# Altium schematic symbol library LATTICEPLDS_Library.SchLib: 291 symbols (part 29 of 32) (continued)
## LFXP2-40E-FPBGA672
designator U?  Data Sheet Version: Preliminary
SPLIT_INST: TRUE; SWAP_INFO: (S1+S2+S3+S4+S5+S6+S7+S8+S9+S10)
part A pins: A2 GND (power), A25 GND (power), AA3 GND (power), AA9 GND (power), AA18 GND (power), AA24 GND (power), AD6 GND (power), AD11 GND (power), AD16 GND (power), AD21 GND (power), AE1 GND (power), AE26 GND (power), AF2 GND (power), AF25 GND (power), B1 GND (power), B26 GND (power), C6 GND (power), C11 GND (power), C16 GND (power), C21 GND (power), D5 NC, F3 GND (power), F9 GND (power), F18 GND (power), F24 GND (power), J6 GND (power), J21 GND (power), K10 VCCAUX (power), K11 GND (power), K13 GND (power), K14 GND (power), K16 GND (power), K17 VCCAUX (power), L3 GND (power), L10 VCCAUX (power), L11 GND (power), L12 VCC (power), L13 VCC (power), L14 VCC (power), L15 VCC (power), L16 GND (power), L17 VCCAUX (power), L24 GND (power), M3 CFG0, M11 VCC (power), M12 VCC (power), M13 GND (power), M14 GND (power), M15 VCC (power), M16 VCC (power), N4 TOE, N9 GND (power), N10 GND (power), N11 VCC (power), N12 GND (power), N13 GND (power), N14 GND (power), N15 GND (power), N16 VCC (power), N17 GND (power), N18 GND (power), P9 GND (power), P10 GND (power), P11 VCC (power), P12 GND (power), P13 GND (power), P14 GND (power), P15 GND (power), P16 VCC (power), P17 GND (power), P18 GND (power), R11 VCC (power), R12 VCC (power), R13 GND (power), R14 GND (power), R15 VCC (power), R16 VCC (power), T3 GND (power), T10 VCCAUX (power), T11 GND (power), T12 VCC (power), T13 VCC (power), T14 VCC (power), T15 VCC (power), T16 GND (power), T17 VCCAUX (power), T24 GND (power), U10 VCCAUX (power), U11 GND (power), U13 GND (power), U14 GND (power), U16 GND (power), U17 VCCAUX (power), V6 GND (power), V21 GND (power)
part B pins: A3 PT4B, A4 PT9A, A5 PT9B, A6 PT10B, A7 PT14A, A8 PT17A, A9 PT18A, A10 PT22A, A11 PT25A, A12 PT26A, A13 PT29A, A14 PT33A, B3 PT4A, B4 PT6A, B5 PT6B, B6 PT10A, B7 PT14B, B8 PT17B, B9 PT18B, B10 PT22B, B11 PT25B, B12 PT26B, B13 PT29B, B14 PT33B, C4 PT5A, C5 PT5B, C7 PT7B, C8 PT13A, C9 PT15B, C10 PT21A, C12 PT30A, C13 PT34A, C14 PT37A, C15 PT37B, D6 VCCIO0 (power), D7 PT7A, D8 PT13B, D9 PT15A, D10 PT21B, D11 VCCIO0 (power), D12 PT30B, D13 PT34B, E7 PT11A, E8 PT11B, E9 PT16A, E10 PT16B, E11 PT27B, E12 PT31B, E13 PT35B, F7 PT3A, F8 PT8B, F10 PT23B, F11 PT27A, F12 PT31A, F13 PT35A, G7 PT3B, G8 PT8A, G9 VCCIO0 (power), G10 PT19B, G11 PT23A, G12 PT32A, G13 PT32B, H8 PT12B, H9 PT12A, H10 PT19A, H11 PT24A, H12 PT28A, H13 PT36B, J9 PT20A, J10 PT24B, J11 PT28B, J12 PT36A, K9 PT20B, K12 VCCIO0 (power)
part C pins: A15 PT38A, A16 PT41A, A17 PT42A, A18 PT45A, A19 PT46A, A20 PT53A, A21 PT58A, A22 PT61A, A23 PT61B, A24 PT62B, B15 PT38B, B16 PT41B, B17 PT42B, B18 PT45B, B19 PT46B, B20 PT53B, B21 PT58B, B22 PT63A, B23 PT62A, B24 PT65B, B25 PT66B, C17 PT47B, C18 PT49A, C19 PT50A, C20 PT54A, C22 PT63B, C23 PT65A, C24 PT66A, C25 PT71A, C26 PT71B, D14 PT39B, D15 PT43B, D16 VCCIO1 (power), D17 PT47A, D18 PT49B, D19 PT50B, D20 PT54B, D21 VCCIO1 (power), D22 PT67A, D23 PT69A, E14 PT43A, E15 PT48A, E16 PT51B, E17 PT55B, E18 PT55A, E19 PT57A, E20 PT59B, E21 PT59A, E22 PT67B, E23 PT69B, F14 PT39A, F15 PT48B, F16 PT51A, F17 PT56B, F19 PT57B, F20 PT70A, G14 PT44A, G15 PT44B, G16 PT56A, G17 PT64A, G18 VCCIO1 (power), G19 PT70B, G20 PT72B, H14 PT40B, H15 PT52B, H16 PT64B, H17 PT68B, H18 PT68A, H19 PT72A, J13 PT40A, J14 PT52A, J15 PT60A, J16 PT60B, K15 VCCIO1 (power)
part D pins: D24 PR4A, D25 PR7A, D26 PR7B, E24 PR4B, E25 PR8A, E26 PR8B, F21 PR6B, F22 PR5B, F23 VCCIO2 (power), F25 PR12A, F26 PR12B, G21 PR5A, G22 PR6A, G23 PR11B, G24 PR11A, G25 PR15B, G26 PR15A, H20 PR9A, H21 PR9B, H22 PR13A, H23 PR14B, H24 PR14A, H25 PR19B, H26 PR19A, J17 PR22A, J18 PR10B, J19 PR10A, J20 VCCIO2 (power), J22 PR13B, J23 PR16B, J24 PR16A, J25 PR24B, J26 PR24A, K18 PR22B, K19 PR17B, K20 PR17A, K21 PR18B, K22 PR18A, K23 PR21B, K24 PR21A, K25 PR25B, K26 PR25A, L18 PR30A, L19 PR26B, L20 PR26A, L21 PR23B, L22 PR23A, L23 VCCIO2 (power), L25 PR28B, L26 PR28A, M17 VCCIO2 (power), M18 PR31B, M19 PR30B, M20 PR31A, M21 PR27B, M22 PR27A, M23 PR29B, M24 PR29A, M25 PR32B, M26 PR32A, N19 PR35B, N20 PR35A, N21 PR34A, N22 PR34B, N23 PR33B, N24 PR33A, N25 PR36B, N26 PR36A
part E pins: AA21 PR67B, AA22 PR69A, AA23 VCCIO3 (power), AA25 PR55B, AA26 PR55A, AB21 PR69B, AB22 PR71B, AB23 PR62B, AB24 PR62A, AB25 PR58B, AB26 PR58A, AC22 PR71A, AC23 PR63B, AC24 PR63A, AC25 PR59B, AC26 PR59A, AD23 PR70B, AD24 PR70A, AD25 PR66B, AD26 PR66A, P19 PR39A, P25 PR38B, P26 PR38A, R17 VCCIO3 (power), R18 PR39B, R19 PR43A, R20 PR43B, R21 PR40B, R22 PR40A, R23 PR42B, R24 PR42A, R25 PR41B, R26 PR41A, T18 PR47A, T19 PR47B, T20 PR51B, T21 PR51A, T22 PR44B, T23 VCCIO3 (power), T25 PR45B, T26 PR45A, U18 PR56A, U19 PR56B, U20 PR60B, U21 PR60A, U22 PR44A, U23 PR48B, U24 PR48A, U25 PR46B, U26 PR46A, V19 PR68A, V20 VCCIO3 (power), V22 PR64A, V23 PR52B, V24 PR52A, V25 PR49B, V26 PR49A, W20 PR68B, W21 PR64B, W22 PR65A, W23 PR57B, W24 PR57A, W25 PR50B, W26 PR50A, Y21 PR65B, Y22 PR67A, Y23 PR61B, Y24 PR61A, Y25 PR53B, Y26 PR53A
part F pins: AA14 PB39A, AA15 PB44B, AA16 PB47A, AA17 PB59A, AA19 PB68A, AA20 PB71B, AB14 PB39B, AB15 PB44A, AB16 PB47B, AB17 PB59B, AB18 PB63A, AB19 PB63B, AB20 PB71A, AC15 PB43A, AC16 VCCIO4 (power), AC17 PB51A, AC18 PB55A, AC19 PB67A, AC20 PB70B, AC21 VCCIO4 (power), AD15 PB43B, AD17 PB51B, AD18 PB55B, AD19 PB67B, AD20 PB70A, AD22 PB69B, AE10 PB38A, AE11 PB41A, AE12 PB42A, AE13 PB45A, AE14 PB46A, AE15 PB49A, AE16 PB50A, AE17 PB53A, AE18 PB54A, AE19 PB57A, AE20 PB58A, AE21 PB61B, AE22 PB62B, AE23 PB69A, AE24 PB66B, AE25 PB66A, AF10 PB38B, AF11 PB41B, AF12 PB42B, AF13 PB45B, AF14 PB46B, AF15 PB49B, AF16 PB50B, AF17 PB53B, AF18 PB54B, AF19 PB57B, AF20 PB58B, AF21 PB61A, AF22 PB62A, AF23 PB65A, AF24 PB65B, U15 VCCIO4 (power), V15 PB40A, V16 PB52A, V17 PB60A, V18 PB64A, W15 PB40B, W16 PB52B, W17 PB60B, W18 PB64B, W19 PB72A, Y14 PB48A, Y15 PB48B, Y16 PB56A, Y17 PB56B, Y18 VCCIO4 (power), Y19 PB68B, Y20 PB72B
part G pins: AA7 PB5A, AA8 PB3A, AA10 PB15B, AA11 PB20B, AA12 PB23A, AA13 PB36B, AB3 PB4A, AB4 PB4B, AB5 PB9A, AB6 PB7B, AB7 PB7A, AB8 PB11A, AB9 PB18A, AB10 PB18B, AB11 PB19A, AB12 PB23B, AB13 PB36A, AC3 PB6A, AC4 PB6B, AC5 PB9B, AC6 VCCIO5 (power), AC7 PB11B, AC8 PB22A, AC9 PB22B, AC10 PB19B, AC11 VCCIO5 (power), AC12 PB27A, AC13 PB31A, AC14 PB35A, AD1 PB10A, AD2 PB10B, AD3 PB14A, AD4 PB13A, AD5 PB13B, AD7 PB29B, AD8 PB29A, AD9 PB33B, AD10 PB33A, AD12 PB27B, AD13 PB31B, AD14 PB35B, AE2 PB14B, AE3 PB17A, AE4 PB21A, AE5 PB21B, AE6 PB26A, AE7 PB30A, AE8 PB34A, AE9 PB37A, AF3 PB17B, AF4 PB25A, AF5 PB25B, AF6 PB26B, AF7 PB30B, AF8 PB34B, AF9 PB37B, U12 VCCIO5 (power), V10 PB8A, V11 PB12A, V12 PB16A, V13 PB24A, V14 PB32A, W9 PB5B, W10 PB8B, W11 PB12B, W12 PB16B, W13 PB24B, W14 PB32B, Y8 PB3B, Y9 VCCIO5 (power), Y10 PB15A, Y11 PB20A, Y12 PB28A, Y13 PB28B
part H pins: AA1 PL67A, AA2 PL67B, AA4 VCCIO6 (power), AA5 PL64A, AA6 PL69A, AB1 PL70A, AB2 PL70B, AC1 PL68A, AC2 PL68B, N1 PL38B, N2 PL38A, N3 PL41A, P1 PL42B, P2 PL42A, P3 PL41B, P4 PL44A, P5 PL40A, P6 PL40B, P7 PL39B, P8 PL39A, R1 PL46B, R2 PL46A, R3 PL45B, R4 PL45A, R5 PL44B, R6 PL43A, R7 PL43B, R8 PL47B, R9 PL47A, R10 VCCIO6 (power), T1 PL49B, T2 PL49A, T4 VCCIO6 (power), T5 PL48A, T6 PL48B, T7 PL60B, T8 PL51B, T9 PL51A, U1 PL53B, U2 PL53A, U3 PL50B, U4 PL50A, U5 PL52A, U6 PL52B, U7 PL60A, U8 PL56B, U9 PL56A, V1 PL58B, V2 PL58A, V3 PL55B, V4 PL55A, V5 PL57B, V7 VCCIO6 (power), V8 PL61A, V9 PL61B, W1 PL62B, W2 PL62A, W3 PL59B, W4 PL59A, W5 PL57A, W6 PL65A, W7 PL65B, W8 PL71A, Y1 PL66B, Y2 PL66A, Y3 PL63B, Y4 PL63A, Y5 PL64B, Y6 PL69B, Y7 PL71B
part I pins: B2 PL4B, C1 PL8A, C2 PL7A, C3 PL4A, D1 PL15A, D2 PL8B, D3 PL7B, D4 PL10A, E1 PL15B, E2 PL12B, E3 PL12A, E4 PL10B, E5 PL11A, E6 PL5A, F1 PL16B, F2 PL16A, F4 VCCIO7 (power), F5 PL11B, F6 PL5B, G1 PL25B, G2 PL25A, G3 PL19B, G4 PL19A, G5 PL6A, G6 PL6B, H1 PL29B, H2 PL29A, H3 PL24A, H4 PL14A, H5 PL13B, H6 PL13A, H7 PL9A, J1 PL32B, J2 PL32A, J3 PL24B, J4 PL21B, J5 PL14B, J7 VCCIO7 (power), J8 PL9B, K1 PL33B, K2 PL33A, K3 PL28B, K4 PL28A, K5 PL21A, K6 PL17B, K7 PL17A, K8 PL18A, L1 PL35B, L2 PL35A, L4 VCCIO7 (power), L5 PL23A, L6 PL23B, L7 PL22A, L8 PL22B, L9 PL18B, M1 PL36B, M2 PL36A, M4 PL31A, M5 PL31B, M6 PL27A, M7 PL27B, M8 PL26A, M9 PL26B, M10 VCCIO7 (power), N5 PL34B, N6 PL34A, N7 PL30B, N8 PL30A
part J pins: P20 VCCJ (power), P21 TCK (in), P22 TDO (out), P23 TDI (in), P24 TMS (in)
part A text: SUPPLIES
part B text: BANK 0
part C text: BANK 1
part D text: BANK 2
part E text: BANK 3
part F text: BANK 4
part G text: BANK 5
part H text: BANK 6
part I text: BANK 7

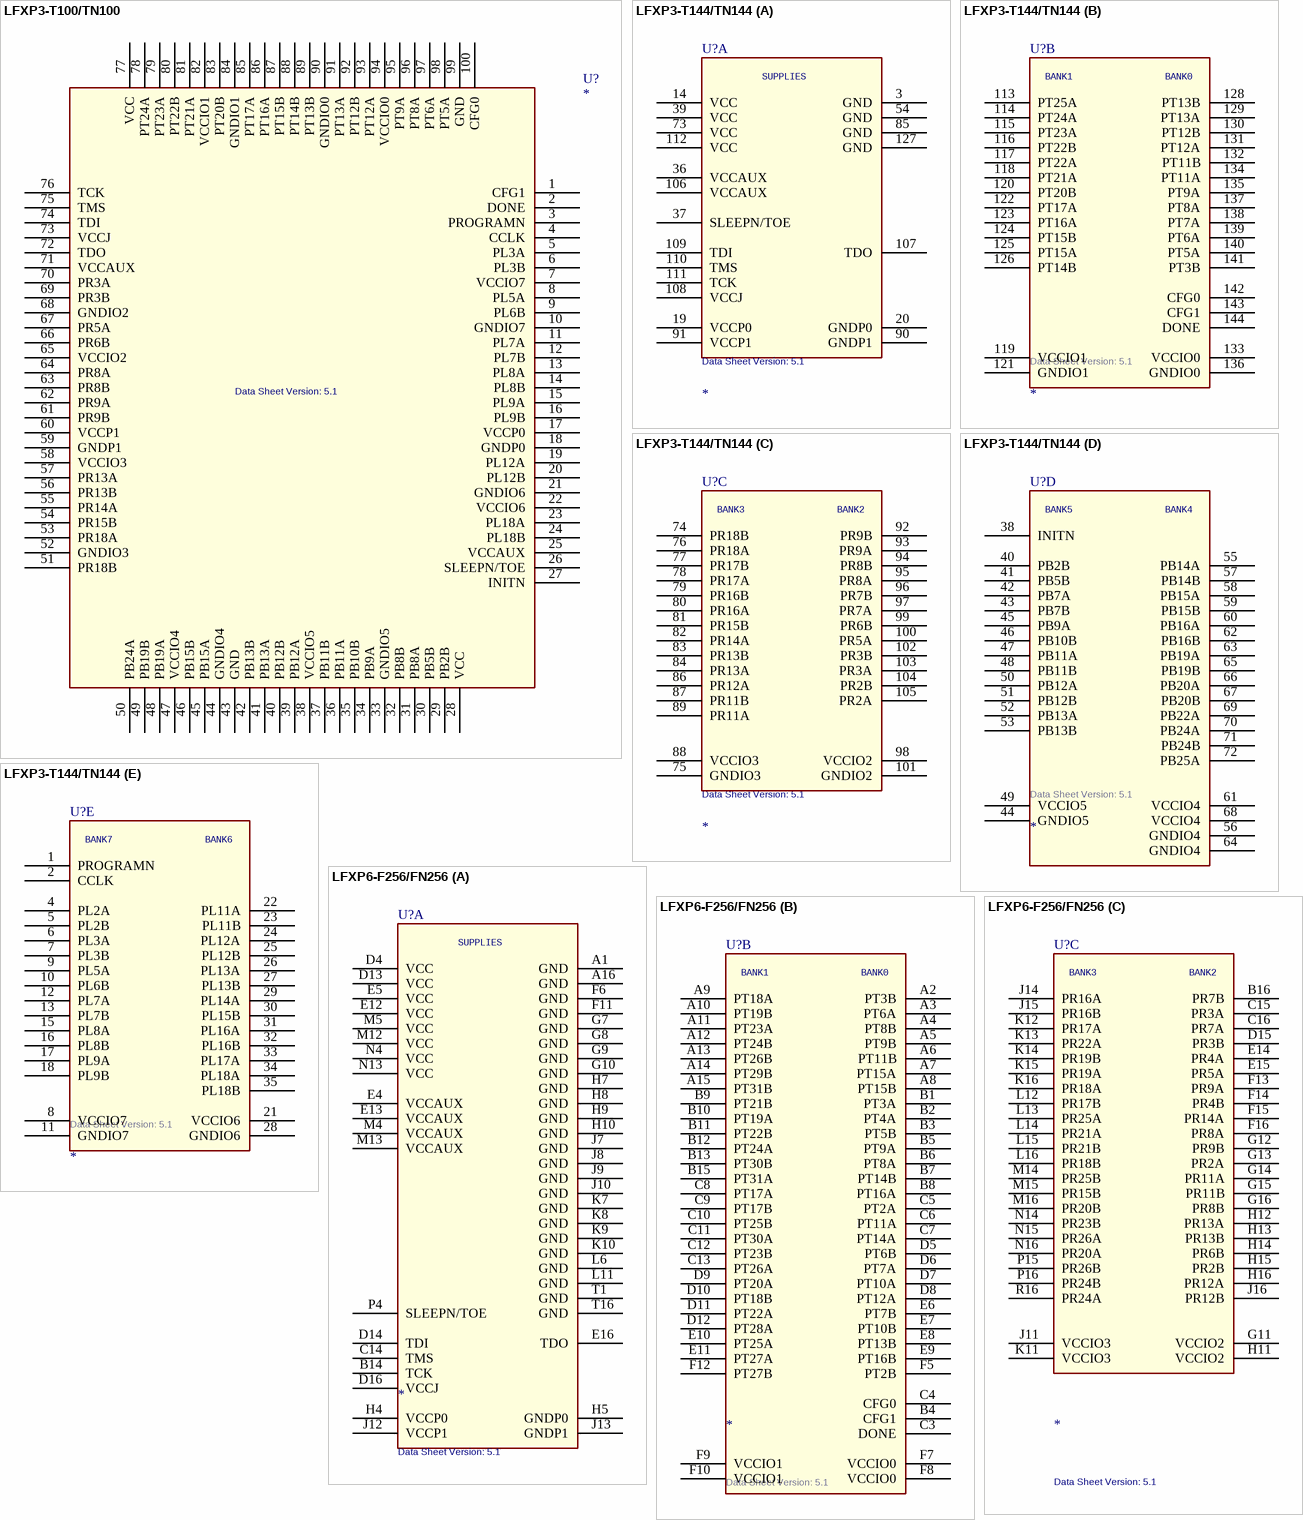
[diagram p267: symbols LFXP3-T100/TN100 to LFXP6-F256/FN256]

## LFXP3-T100/TN100
designator U?  Data Sheet Version: 5.1
pins: 1 CFG1, 2 DONE, 3 PROGRAMN, 4 CCLK, 5 PL3A, 6 PL3B, 7 VCCIO7, 8 PL5A, 9 PL6B, 10 GNDIO7, 11 PL7A, 12 PL7B, 13 PL8A, 14 PL8B, 15 PL9A, 16 PL9B, 17 VCCP0, 18 GNDP0, 19 PL12A, 20 PL12B, 21 GNDIO6, 22 VCCIO6, 23 PL18A, 24 PL18B, 25 VCCAUX, 26 SLEEPN/TOE, 27 INITN, 28 VCC, 29 PB2B, 30 PB5B, 31 PB8A, 32 PB8B, 33 GNDIO5, 34 PB9A, 35 PB10B, 36 PB11A, 37 PB11B, 38 VCCIO5, 39 PB12A, 40 PB12B, 41 PB13A, 42 PB13B, 43 GND, 44 GNDIO4, 45 PB15A, 46 PB15B, 47 VCCIO4, 48 PB19A, 49 PB19B, 50 PB24A, 51 PR18B, 52 GNDIO3, 53 PR18A, 54 PR15B, 55 PR14A, 56 PR13B, 57 PR13A, 58 VCCIO3, 59 GNDP1, 60 VCCP1, 61 PR9B, 62 PR9A, 63 PR8B, 64 PR8A, 65 VCCIO2, 66 PR6B, 67 PR5A, 68 GNDIO2, 69 PR3B, 70 PR3A, 71 VCCAUX, 72 TDO, 73 VCCJ, 74 TDI, 75 TMS, 76 TCK, 77 VCC, 78 PT24A, 79 PT23A, 80 PT22B, 81 PT21A, 82 VCCIO1, 83 PT20B, 84 GNDIO1, 85 PT17A, 86 PT16A, 87 PT15B, 88 PT14B, 89 PT13B, 90 GNDIO0, 91 PT13A, 92 PT12B, 93 PT12A, 94 VCCIO0, 95 PT9A, 96 PT8A, 97 PT6A, 98 PT5A, 99 GND, 100 CFG0

## LFXP3-T144/TN144
designator U?  Data Sheet Version: 5.1
SPLIT_INST: TRUE; SWAP_INFO: (S1+S2+S3+S4+S5)
part A pins: 3 GND (power), 14 VCC (power), 19 VCCP0 (power), 20 GNDP0 (power), 36 VCCAUX (power), 37 SLEEPN/TOE, 39 VCC (power), 54 GND (power), 73 VCC (power), 85 GND (power), 90 GNDP1 (power), 91 VCCP1 (power), 106 VCCAUX (power), 107 TDO, 108 VCCJ (power), 109 TDI, 110 TMS, 111 TCK, 112 VCC (power), 127 GND (power)
part B pins: 113 PT25A, 114 PT24A, 115 PT23A, 116 PT22B, 117 PT22A, 118 PT21A, 119 VCCIO1 (power), 120 PT20B, 121 GNDIO1 (power), 122 PT17A, 123 PT16A, 124 PT15B, 125 PT15A, 126 PT14B, 128 PT13B, 129 PT13A, 130 PT12B, 131 PT12A, 132 PT11B, 133 VCCIO0 (power), 134 PT11A, 135 PT9A, 136 GNDIO0 (power), 137 PT8A, 138 PT7A, 139 PT6A, 140 PT5A, 141 PT3B, 142 CFG0, 143 CFG1, 144 DONE
part C pins: 74 PR18B, 75 GNDIO3 (power), 76 PR18A, 77 PR17B, 78 PR17A, 79 PR16B, 80 PR16A, 81 PR15B, 82 PR14A, 83 PR13B, 84 PR13A, 86 PR12A, 87 PR11B, 88 VCCIO3 (power), 89 PR11A, 92 PR9B, 93 PR9A, 94 PR8B, 95 PR8A, 96 PR7B, 97 PR7A, 98 VCCIO2 (power), 99 PR6B, 100 PR5A, 101 GNDIO2 (power), 102 PR3B, 103 PR3A, 104 PR2B, 105 PR2A
part D pins: 38 INITN, 40 PB2B, 41 PB5B, 42 PB7A, 43 PB7B, 44 GNDIO5 (power), 45 PB9A, 46 PB10B, 47 PB11A, 48 PB11B, 49 VCCIO5 (power), 50 PB12A, 51 PB12B, 52 PB13A, 53 PB13B, 55 PB14A, 56 GNDIO4 (power), 57 PB14B, 58 PB15A, 59 PB15B, 60 PB16A, 61 VCCIO4 (power), 62 PB16B, 63 PB19A, 64 GNDIO4 (power), 65 PB19B, 66 PB20A, 67 PB20B, 68 VCCIO4 (power), 69 PB22A, 70 PB24A, 71 PB24B, 72 PB25A
part E pins: 1 PROGRAMN, 2 CCLK, 4 PL2A, 5 PL2B, 6 PL3A, 7 PL3B, 8 VCCIO7 (power), 9 PL5A, 10 PL6B, 11 GNDIO7 (power), 12 PL7A, 13 PL7B, 15 PL8A, 16 PL8B, 17 PL9A, 18 PL9B, 21 VCCIO6 (power), 22 PL11A, 23 PL11B, 24 PL12A, 25 PL12B, 26 PL13A, 27 PL13B, 28 GNDIO6 (power), 29 PL14A, 30 PL15B, 31 PL16A, 32 PL16B, 33 PL17A, 34 PL18A, 35 PL18B
part A text: SUPPLIES
part B text: BANK1; BANK0
part C text: BANK3; BANK2
part D text: BANK5; BANK4
part E text: BANK7; BANK6

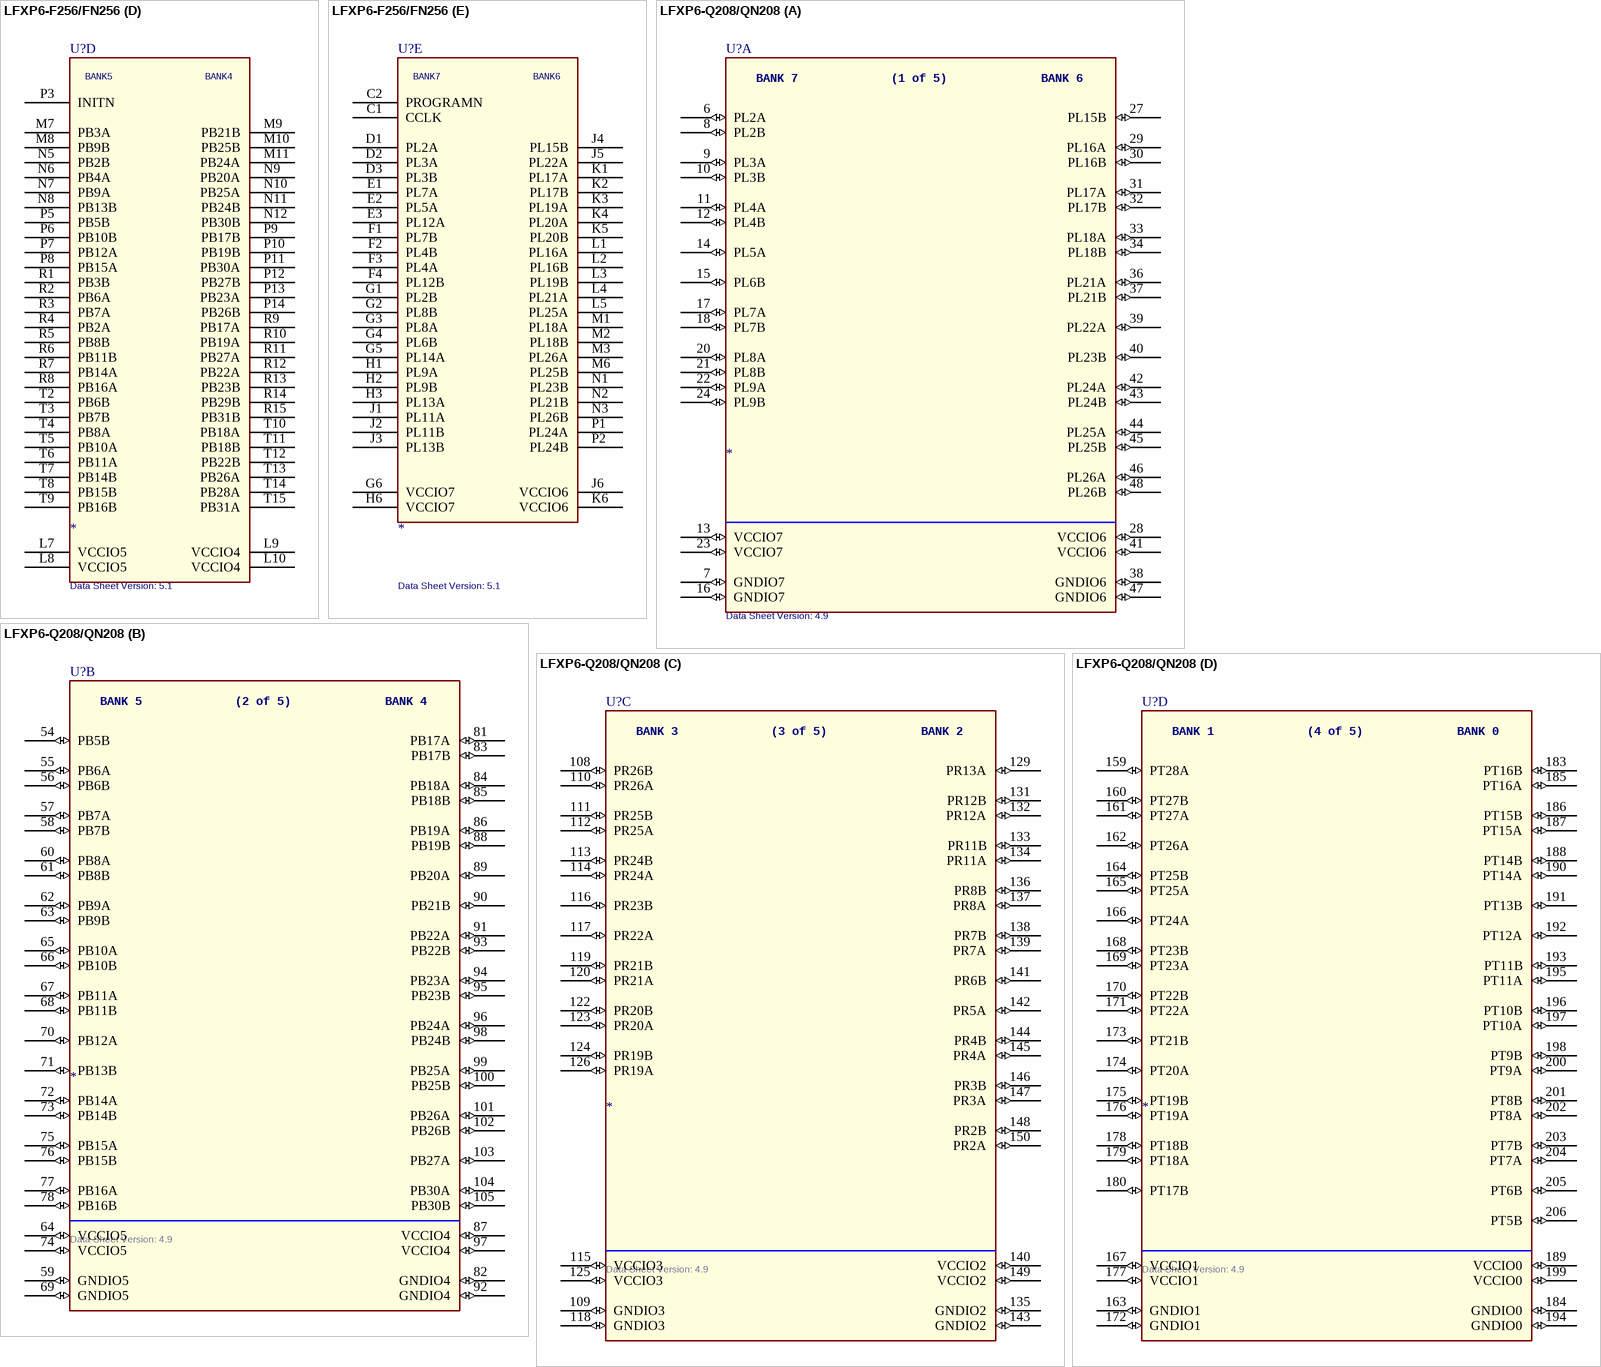
[diagram p268: symbols LFXP6-F256/FN256 to LFXP6-Q208/QN208]

## LFXP6-F256/FN256
designator U?  Data Sheet Version: 5.1
SPLIT_INST: TRUE; SWAP_INFO: (S1+S2+S3+S4+S5)
part A pins: A1 GND (power), A16 GND (power), B14 TCK, C14 TMS, D4 VCC (power), D13 VCC (power), D14 TDI, D16 VCCJ (power), E4 VCCAUX (power), E5 VCC (power), E12 VCC (power), E13 VCCAUX (power), E16 TDO, F6 GND (power), F11 GND (power), G7 GND (power), G8 GND (power), G9 GND (power), G10 GND (power), H4 VCCP0 (power), H5 GNDP0 (power), H7 GND (power), H8 GND (power), H9 GND (power), H10 GND (power), J7 GND (power), J8 GND (power), J9 GND (power), J10 GND (power), J12 VCCP1 (power), J13 GNDP1 (power), K7 GND (power), K8 GND (power), K9 GND (power), K10 GND (power), L6 GND (power), L11 GND (power), M4 VCCAUX (power), M5 VCC (power), M12 VCC (power), M13 VCCAUX (power), N4 VCC (power), N13 VCC (power), P4 SLEEPN/TOE, T1 GND (power), T16 GND (power)
part B pins: A2 PT3B, A3 PT6A, A4 PT8B, A5 PT9B, A6 PT11B, A7 PT15A, A8 PT15B, A9 PT18A, A10 PT19B, A11 PT23A, A12 PT24B, A13 PT26B, A14 PT29B, A15 PT31B, B1 PT3A, B2 PT4A, B3 PT5B, B4 CFG1, B5 PT9A, B6 PT8A, B7 PT14B, B8 PT16A, B9 PT21B, B10 PT19A, B11 PT22B, B12 PT24A, B13 PT30B, B15 PT31A, C3 DONE, C4 CFG0, C5 PT2A, C6 PT11A, C7 PT14A, C8 PT17A, C9 PT17B, C10 PT25B, C11 PT30A, C12 PT23B, C13 PT26A, D5 PT6B, D6 PT7A, D7 PT10A, D8 PT12A, D9 PT20A, D10 PT18B, D11 PT22A, D12 PT28A, E6 PT7B, E7 PT10B, E8 PT13B, E9 PT16B, E10 PT25A, E11 PT27A, F5 PT2B, F7 VCCIO0 (power), F8 VCCIO0 (power), F9 VCCIO1 (power), F10 VCCIO1 (power), F12 PT27B
part C pins: B16 PR7B, C15 PR3A, C16 PR7A, D15 PR3B, E14 PR4A, E15 PR5A, F13 PR9A, F14 PR4B, F15 PR14A, F16 PR8A, G11 VCCIO2 (power), G12 PR9B, G13 PR2A, G14 PR11A, G15 PR11B, G16 PR8B, H11 VCCIO2 (power), H12 PR13A, H13 PR13B, H14 PR6B, H15 PR2B, H16 PR12A, J11 VCCIO3 (power), J14 PR16A, J15 PR16B, J16 PR12B, K11 VCCIO3 (power), K12 PR17A, K13 PR22A, K14 PR19B, K15 PR19A, K16 PR18A, L12 PR17B, L13 PR25A, L14 PR21A, L15 PR21B, L16 PR18B, M14 PR25B, M15 PR15B, M16 PR20B, N14 PR23B, N15 PR26A, N16 PR20A, P15 PR26B, P16 PR24B, R16 PR24A
part D pins: L7 VCCIO5 (power), L8 VCCIO5 (power), L9 VCCIO4 (power), L10 VCCIO4 (power), M7 PB3A, M8 PB9B, M9 PB21B, M10 PB25B, M11 PB24A, N5 PB2B, N6 PB4A, N7 PB9A, N8 PB13B, N9 PB20A, N10 PB25A, N11 PB24B, N12 PB30B, P3 INITN, P5 PB5B, P6 PB10B, P7 PB12A, P8 PB15A, P9 PB17B, P10 PB19B, P11 PB30A, P12 PB27B, P13 PB23A, P14 PB26B, R1 PB3B, R2 PB6A, R3 PB7A, R4 PB2A, R5 PB8B, R6 PB11B, R7 PB14A, R8 PB16A, R9 PB17A, R10 PB19A, R11 PB27A, R12 PB22A, R13 PB23B, R14 PB29B, R15 PB31B, T2 PB6B, T3 PB7B, T4 PB8A, T5 PB10A, T6 PB11A, T7 PB14B, T8 PB15B, T9 PB16B, T10 PB18A, T11 PB18B, T12 PB22B, T13 PB26A, T14 PB28A, T15 PB31A
part E pins: C1 CCLK, C2 PROGRAMN, D1 PL2A, D2 PL3A, D3 PL3B, E1 PL7A, E2 PL5A, E3 PL12A, F1 PL7B, F2 PL4B, F3 PL4A, F4 PL12B, G1 PL2B, G2 PL8B, G3 PL8A, G4 PL6B, G5 PL14A, G6 VCCIO7 (power), H1 PL9A, H2 PL9B, H3 PL13A, H6 VCCIO7 (power), J1 PL11A, J2 PL11B, J3 PL13B, J4 PL15B, J5 PL22A, J6 VCCIO6 (power), K1 PL17A, K2 PL17B, K3 PL19A, K4 PL20A, K5 PL20B, K6 VCCIO6 (power), L1 PL16A, L2 PL16B, L3 PL19B, L4 PL21A, L5 PL25A, M1 PL18A, M2 PL18B, M3 PL26A, M6 PL25B, N1 PL23B, N2 PL21B, N3 PL26B, P1 PL24A, P2 PL24B
part A text: SUPPLIES
part B text: BANK1; BANK0
part C text: BANK3; BANK2
part D text: BANK5; BANK4
part E text: BANK7; BANK6

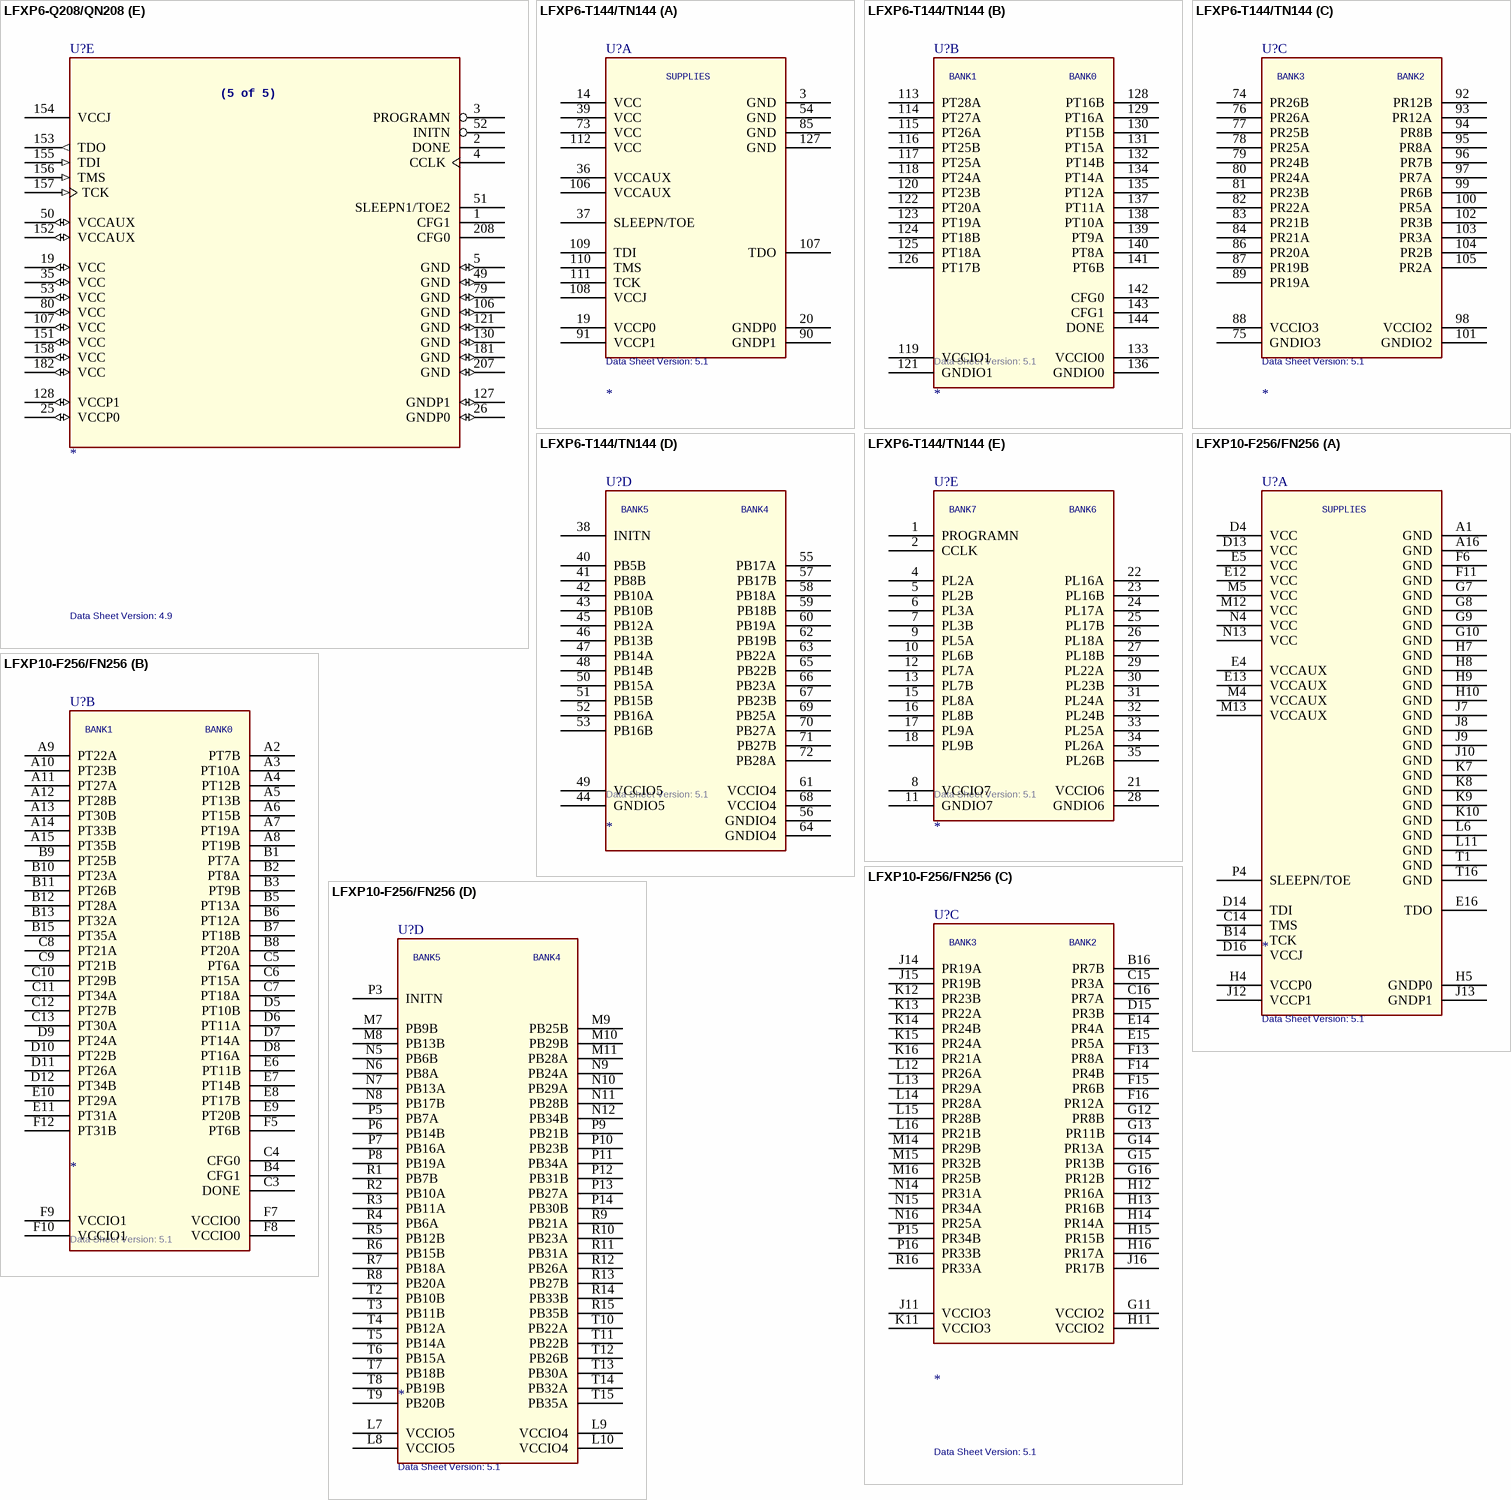
[diagram p269: symbols LFXP6-Q208/QN208 to LFXP10-F256/FN256]

## LFXP6-Q208/QN208
designator U?  Data Sheet Version: 4.9
SWAP_INFO: (S1+S2+S3+S4+S5); SPLIT_INST: TRUE
part A pins: 6 PL2A (io), 7 GNDIO7 (io), 8 PL2B (io), 9 PL3A (io), 10 PL3B (io), 11 PL4A (io), 12 PL4B (io), 13 VCCIO7 (io), 14 PL5A (io), 15 PL6B (io), 16 GNDIO7 (io), 17 PL7A (io), 18 PL7B (io), 20 PL8A (io), 21 PL8B (io), 22 PL9A (io), 23 VCCIO7 (io), 24 PL9B (io), 27 PL15B (io), 28 VCCIO6 (io), 29 PL16A (io), 30 PL16B (io), 31 PL17A (io), 32 PL17B (io), 33 PL18A (io), 34 PL18B (io), 36 PL21A (io), 37 PL21B (io), 38 GNDIO6 (io), 39 PL22A (io), 40 PL23B (io), 41 VCCIO6 (io), 42 PL24A (io), 43 PL24B (io), 44 PL25A (io), 45 PL25B (io), 46 PL26A (io), 47 GNDIO6 (io), 48 PL26B (io)
part B pins: 54 PB5B (io), 55 PB6A (io), 56 PB6B (io), 57 PB7A (io), 58 PB7B (io), 59 GNDIO5 (io), 60 PB8A (io), 61 PB8B (io), 62 PB9A (io), 63 PB9B (io), 64 VCCIO5 (io), 65 PB10A (io), 66 PB10B (io), 67 PB11A (io), 68 PB11B (io), 69 GNDIO5 (io), 70 PB12A (io), 71 PB13B (io), 72 PB14A (io), 73 PB14B (io), 74 VCCIO5 (io), 75 PB15A (io), 76 PB15B (io), 77 PB16A (io), 78 PB16B (io), 81 PB17A (io), 82 GNDIO4 (io), 83 PB17B (io), 84 PB18A (io), 85 PB18B (io), 86 PB19A (io), 87 VCCIO4 (io), 88 PB19B (io), 89 PB20A (io), 90 PB21B (io), 91 PB22A (io), 92 GNDIO4 (io), 93 PB22B (io), 94 PB23A (io), 95 PB23B (io), 96 PB24A (io), 97 VCCIO4 (io), 98 PB24B (io), 99 PB25A (io), 100 PB25B (io), 101 PB26A (io), 102 PB26B (io), 103 PB27A (io), 104 PB30A (io), 105 PB30B (io)
part C pins: 108 PR26B (io), 109 GNDIO3 (io), 110 PR26A (io), 111 PR25B (io), 112 PR25A (io), 113 PR24B (io), 114 PR24A (io), 115 VCCIO3 (io), 116 PR23B (io), 117 PR22A (io), 118 GNDIO3 (io), 119 PR21B (io), 120 PR21A (io), 122 PR20B (io), 123 PR20A (io), 124 PR19B (io), 125 VCCIO3 (io), 126 PR19A (io), 129 PR13A (io), 131 PR12B (io), 132 PR12A (io), 133 PR11B (io), 134 PR11A (io), 135 GNDIO2 (io), 136 PR8B (io), 137 PR8A (io), 138 PR7B (io), 139 PR7A (io), 140 VCCIO2 (io), 141 PR6B (io), 142 PR5A (io), 143 GNDIO2 (io), 144 PR4B (io), 145 PR4A (io), 146 PR3B (io), 147 PR3A (io), 148 PR2B (io), 149 VCCIO2 (io), 150 PR2A (io)
part D pins: 159 PT28A (io), 160 PT27B (io), 161 PT27A (io), 162 PT26A (io), 163 GNDIO1 (io), 164 PT25B (io), 165 PT25A (io), 166 PT24A (io), 167 VCCIO1 (io), 168 PT23B (io), 169 PT23A (io), 170 PT22B (io), 171 PT22A (io), 172 GNDIO1 (io), 173 PT21B (io), 174 PT20A (io), 175 PT19B (io), 176 PT19A (io), 177 VCCIO1 (io), 178 PT18B (io), 179 PT18A (io), 180 PT17B (io), 183 PT16B (io), 184 GNDIO0 (io), 185 PT16A (io), 186 PT15B (io), 187 PT15A (io), 188 PT14B (io), 189 VCCIO0 (io), 190 PT14A (io), 191 PT13B (io), 192 PT12A (io), 193 PT11B (io), 194 GNDIO0 (io), 195 PT11A (io), 196 PT10B (io), 197 PT10A (io), 198 PT9B (io), 199 VCCIO0 (io), 200 PT9A (io), 201 PT8B (io), 202 PT8A (io), 203 PT7B (io), 204 PT7A (io), 205 PT6B (io), 206 PT5B (io)
part E pins: 1 CFG1, 2 DONE, 3 PROGRAMN, 4 CCLK, 5 GND (io), 19 VCC (io), 25 VCCP0 (io), 26 GNDP0 (io), 35 VCC (io), 49 GND (io), 50 VCCAUX (io), 51 SLEEPN1/TOE2, 52 INITN, 53 VCC (io), 79 GND (io), 80 VCC (io), 106 GND (io), 107 VCC (io), 121 GND (io), 127 GNDP1 (io), 128 VCCP1 (io), 130 GND (io), 151 VCC (io), 152 VCCAUX (io), 153 TDO (out), 154 VCCJ (power), 155 TDI (in), 156 TMS (in), 157 TCK (in), 158 VCC (io), 181 GND (io), 182 VCC (io), 207 GND (io), 208 CFG0
part A text: BANK 7; (1 of 5); BANK 6
part B text: BANK 5; (2 of 5); BANK 4
part C text: BANK 3; (3 of 5); BANK 2
part D text: BANK 1; (4 of 5); BANK 0
part E text: (5 of 5)